# Altium footprint library 691 307 300 0xx.PcbLib: 23 footprints (part 2 of 2)
Each footprint in its own frame and in the unit in brackets; x right, y up, seen from the top. Pads: shape width x height; smd on the part's side, far side on the other; paste and mask are expansions set on the pad; w line width, h text height; cw(c..) or ccw(c..) is an arc to the next point about the centre after c.
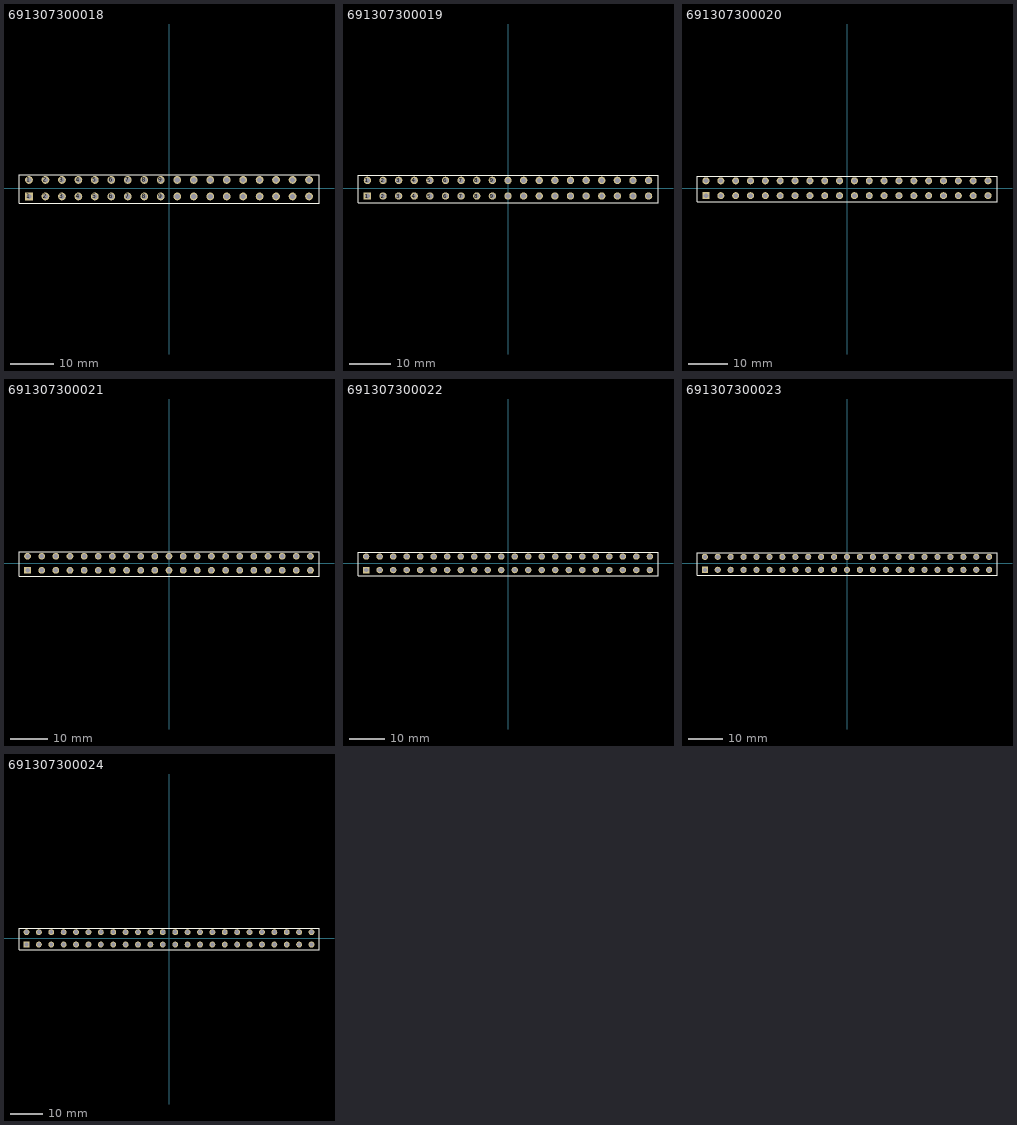
[diagram p1: the footprints below, top view; thin cyan lines are the x and y axes]

## 691307300018 [mm] "Serie 3073 - 3.81 mm _ 18 pins"
height 14.5
pads (36):
  rect 1.8x1.8 hole 1.2: 1(-32.385,-1.905)
  round 1.8 hole 1.2: 1(-32.385,1.905) 2(-28.575,-1.905) 2(-28.575,1.905) 3(-24.765,-1.905) 3(-24.765,1.905) 4(-20.955,-1.905) 4(-20.955,1.905) 5(-17.145,-1.905) 5(-17.145,1.905) 6(-13.335,-1.905) 6(-13.335,1.905) 7(-9.525,-1.905) 7(-9.525,1.905) 8(-5.715,-1.905) 8(-5.715,1.905) 9(-1.905,-1.905) 9(-1.905,1.905) 10(1.905,-1.905) 10(1.905,1.905) 11(5.715,-1.905) 11(5.715,1.905) 12(9.525,-1.905) 12(9.525,1.905) 13(13.335,-1.905) 13(13.335,1.905) 14(17.145,-1.905) 14(17.145,1.905) 15(20.955,-1.905) 15(20.955,1.905) 16(24.765,-1.905) 16(24.765,1.905) 17(28.575,-1.905) 17(28.575,1.905) 18(32.385,-1.905) 18(32.385,1.905)
Top Overlay:
  lines w0.127: -34.685,-3.495 -34.685,3.105 34.685,3.105 34.685,-3.495 -34.685,-3.495
3D body: height 14.55, standoff -3.35, extent -34.685,-3.5 34.685,3.3

## 691307300019 [mm] "Serie 3073 - 3.81 mm _ 19 pins"
height 14.5
pads (38):
  rect 1.8x1.8 hole 1.2: 1(-34.29,-1.905)
  round 1.8 hole 1.2: 1(-34.29,1.905) 2(-30.48,-1.905) 2(-30.48,1.905) 3(-26.67,-1.905) 3(-26.67,1.905) 4(-22.86,-1.905) 4(-22.86,1.905) 5(-19.05,-1.905) 5(-19.05,1.905) 6(-15.24,-1.905) 6(-15.24,1.905) 7(-11.43,-1.905) 7(-11.43,1.905) 8(-7.62,-1.905) 8(-7.62,1.905) 9(-3.81,-1.905) 9(-3.81,1.905) 10(0,-1.905) 10(0,1.905) 11(3.81,-1.905) 11(3.81,1.905) 12(7.62,-1.905) 12(7.62,1.905) 13(11.43,-1.905) 13(11.43,1.905) 14(15.24,-1.905) 14(15.24,1.905) 15(19.05,-1.905) 15(19.05,1.905) 16(22.86,-1.905) 16(22.86,1.905) 17(26.67,-1.905) 17(26.67,1.905) 18(30.48,-1.905) 18(30.48,1.905) 19(34.29,-1.905) 19(34.29,1.905)
Top Overlay:
  lines w0.127: -36.59,-3.495 36.59,-3.495 36.59,3.105 -36.59,3.105 -36.59,-3.495
3D body: height 14.55, standoff -3.35, extent -36.6,-3.5 36.58,3.3

## 691307300020 [mm] "Serie 3073 - 3.81 mm _ 20 pins"
height 14.5
pads (40):
  rect 1.8x1.8 hole 1.2: 1(-36.195,-1.905)
  round 1.8 hole 1.2: 1(-36.195,1.905) 2(-32.385,-1.905) 2(-32.385,1.905) 3(-28.575,-1.905) 3(-28.575,1.905) 4(-24.765,-1.905) 4(-24.765,1.905) 5(-20.955,-1.905) 5(-20.955,1.905) 6(-17.145,-1.905) 6(-17.145,1.905) 7(-13.335,-1.905) 7(-13.335,1.905) 8(-9.525,-1.905) 8(-9.525,1.905) 9(-5.715,-1.905) 9(-5.715,1.905) 10(-1.905,-1.905) 10(-1.905,1.905) 11(1.905,-1.905) 11(1.905,1.905) 12(5.715,-1.905) 12(5.715,1.905) 13(9.525,-1.905) 13(9.525,1.905) 14(13.335,-1.905) 14(13.335,1.905) 15(17.145,-1.905) 15(17.145,1.905) 16(20.955,-1.905) 16(20.955,1.905) 17(24.765,-1.905) 17(24.765,1.905) 18(28.575,-1.905) 18(28.575,1.905) 19(32.385,-1.905) 19(32.385,1.905) 20(36.195,-1.905) 20(36.195,1.905)
Top Overlay:
  lines w0.127: -38.495,-3.495 -38.495,3.105 38.495,3.105 38.495,-3.495 -38.495,-3.495
3D body: height 14.55, standoff -3.35, extent -38.5,-3.5 38.49,3.3

## 691307300021 [mm] "Serie 3073 - 3.81 mm _ 21 pins"
height 14.5
pads (42):
  rect 1.8x1.8 hole 1.2: 1(-38.1,-1.905)
  round 1.8 hole 1.2: 1(-38.1,1.905) 2(-34.29,-1.905) 2(-34.29,1.905) 3(-30.48,-1.905) 3(-30.48,1.905) 4(-26.67,-1.905) 4(-26.67,1.905) 5(-22.86,-1.905) 5(-22.86,1.905) 6(-19.05,-1.905) 6(-19.05,1.905) 7(-15.24,-1.905) 7(-15.24,1.905) 8(-11.43,-1.905) 8(-11.43,1.905) 9(-7.62,-1.905) 9(-7.62,1.905) 10(-3.81,-1.905) 10(-3.81,1.905) 11(0,-1.905) 11(0,1.905) 12(3.81,-1.905) 12(3.81,1.905) 13(7.62,-1.905) 13(7.62,1.905) 14(11.43,-1.905) 14(11.43,1.905) 15(15.24,-1.905) 15(15.24,1.905) 16(19.05,-1.905) 16(19.05,1.905) 17(22.86,-1.905) 17(22.86,1.905) 18(26.67,-1.905) 18(26.67,1.905) 19(30.48,-1.905) 19(30.48,1.905) 20(34.29,-1.905) 20(34.29,1.905) 21(38.1,-1.905) 21(38.1,1.905)
Top Overlay:
  lines w0.127: -40.4,-3.495 -40.4,3.105 40.4,3.105 40.4,-3.495 -40.4,-3.495
3D body: height 14.55, standoff -3.35, extent -40.4,-3.5 40.4,3.3

## 691307300022 [mm] "Serie 3073 - 3.81 mm _ 22 pins"
height 14.5
pads (44):
  rect 1.8x1.8 hole 1.2: 1(-40.005,-1.905)
  round 1.8 hole 1.2: 1(-40.005,1.905) 2(-36.195,-1.905) 2(-36.195,1.905) 3(-32.385,-1.905) 3(-32.385,1.905) 4(-28.575,-1.905) 4(-28.575,1.905) 5(-24.765,-1.905) 5(-24.765,1.905) 6(-20.955,-1.905) 6(-20.955,1.905) 7(-17.145,-1.905) 7(-17.145,1.905) 8(-13.335,-1.905) 8(-13.335,1.905) 9(-9.525,-1.905) 9(-9.525,1.905) 10(-5.715,-1.905) 10(-5.715,1.905) 11(-1.905,-1.905) 11(-1.905,1.905) 12(1.905,-1.905) 12(1.905,1.905) 13(5.715,-1.905) 13(5.715,1.905) 14(9.525,-1.905) 14(9.525,1.905) 15(13.335,-1.905) 15(13.335,1.905) 16(17.145,-1.905) 16(17.145,1.905) 17(20.955,-1.905) 17(20.955,1.905) 18(24.765,-1.905) 18(24.765,1.905) 19(28.575,-1.905) 19(28.575,1.905) 20(32.385,-1.905) 20(32.385,1.905) 21(36.195,-1.905) 21(36.195,1.905) 22(40.005,-1.905) 22(40.005,1.905)
Top Overlay:
  lines w0.127: -42.305,-3.495 42.305,-3.495 42.305,3.105 -42.305,3.105 -42.305,-3.495
3D body: height 14.55, standoff -3.35, extent -42.3,-3.5 42.31,3.3

## 691307300023 [mm] "Serie 3073 - 3.81 mm _ 23 pins"
height 14.5
pads (46):
  rect 1.8x1.8 hole 1.2: 1(-41.91,-1.905)
  round 1.8 hole 1.2: 1(-41.91,1.905) 2(-38.1,-1.905) 2(-38.1,1.905) 3(-34.29,-1.905) 3(-34.29,1.905) 4(-30.48,-1.905) 4(-30.48,1.905) 5(-26.67,-1.905) 5(-26.67,1.905) 6(-22.86,-1.905) 6(-22.86,1.905) 7(-19.05,-1.905) 7(-19.05,1.905) 8(-15.24,-1.905) 8(-15.24,1.905) 9(-11.43,-1.905) 9(-11.43,1.905) 10(-7.62,-1.905) 10(-7.62,1.905) 11(-3.81,-1.905) 11(-3.81,1.905) 12(0,-1.905) 12(0,1.905) 13(3.81,-1.905) 13(3.81,1.905) 14(7.62,-1.905) 14(7.62,1.905) 15(11.43,-1.905) 15(11.43,1.905) 16(15.24,-1.905) 16(15.24,1.905) 17(19.05,-1.905) 17(19.05,1.905) 18(22.86,-1.905) 18(22.86,1.905) 19(26.67,-1.905) 19(26.67,1.905) 20(30.48,-1.905) 20(30.48,1.905) 21(34.29,-1.905) 21(34.29,1.905) 22(38.1,-1.905) 22(38.1,1.905) 23(41.91,-1.905) 23(41.91,1.905)
Top Overlay:
  lines w0.127: -44.21,-3.495 -44.21,3.105 44.21,3.105 44.21,-3.495 -44.21,-3.495
3D body: height 14.55, standoff -3.35, extent -44.2,-3.5 44.22,3.3

## 691307300024 [mm] "Serie 3073 - 3.81 mm _ 24 pins"
height 14.5
pads (48):
  rect 1.8x1.8 hole 1.2: 1(-43.815,-1.905)
  round 1.8 hole 1.2: 1(-43.815,1.905) 2(-40.005,-1.905) 2(-40.005,1.905) 3(-36.195,-1.905) 3(-36.195,1.905) 4(-32.385,-1.905) 4(-32.385,1.905) 5(-28.575,-1.905) 5(-28.575,1.905) 6(-24.765,-1.905) 6(-24.765,1.905) 7(-20.955,-1.905) 7(-20.955,1.905) 8(-17.145,-1.905) 8(-17.145,1.905) 9(-13.335,-1.905) 9(-13.335,1.905) 10(-9.525,-1.905) 10(-9.525,1.905) 11(-5.715,-1.905) 11(-5.715,1.905) 12(-1.905,-1.905) 12(-1.905,1.905) 13(1.905,-1.905) 13(1.905,1.905) 14(5.715,-1.905) 14(5.715,1.905) 15(9.525,-1.905) 15(9.525,1.905) 16(13.335,-1.905) 16(13.335,1.905) 17(17.145,-1.905) 17(17.145,1.905) 18(20.955,-1.905) 18(20.955,1.905) 19(24.765,-1.905) 19(24.765,1.905) 20(28.575,-1.905) 20(28.575,1.905) 21(32.385,-1.905) 21(32.385,1.905) 22(36.195,-1.905) 22(36.195,1.905) 23(40.005,-1.905) 23(40.005,1.905) 24(43.815,-1.905) 24(43.815,1.905)
Top Overlay:
  lines w0.127: -46.115,-3.495 -46.115,3.105 46.115,3.105 46.115,-3.495 -46.112,-3.495
3D body: height 14.55, standoff -3.35, extent -46.1,-3.5 46.13,3.3